# Altium footprint library IC.PcbLib: 93 footprints (part 6 of 6)
Each footprint in its own frame and in the unit in brackets; x right, y up, seen from the top. Pads: shape width x height; smd on the part's side, far side on the other; paste and mask are expansions set on the pad; w line width, h text height; cw(c..) or ccw(c..) is an arc to the next point about the centre after c.
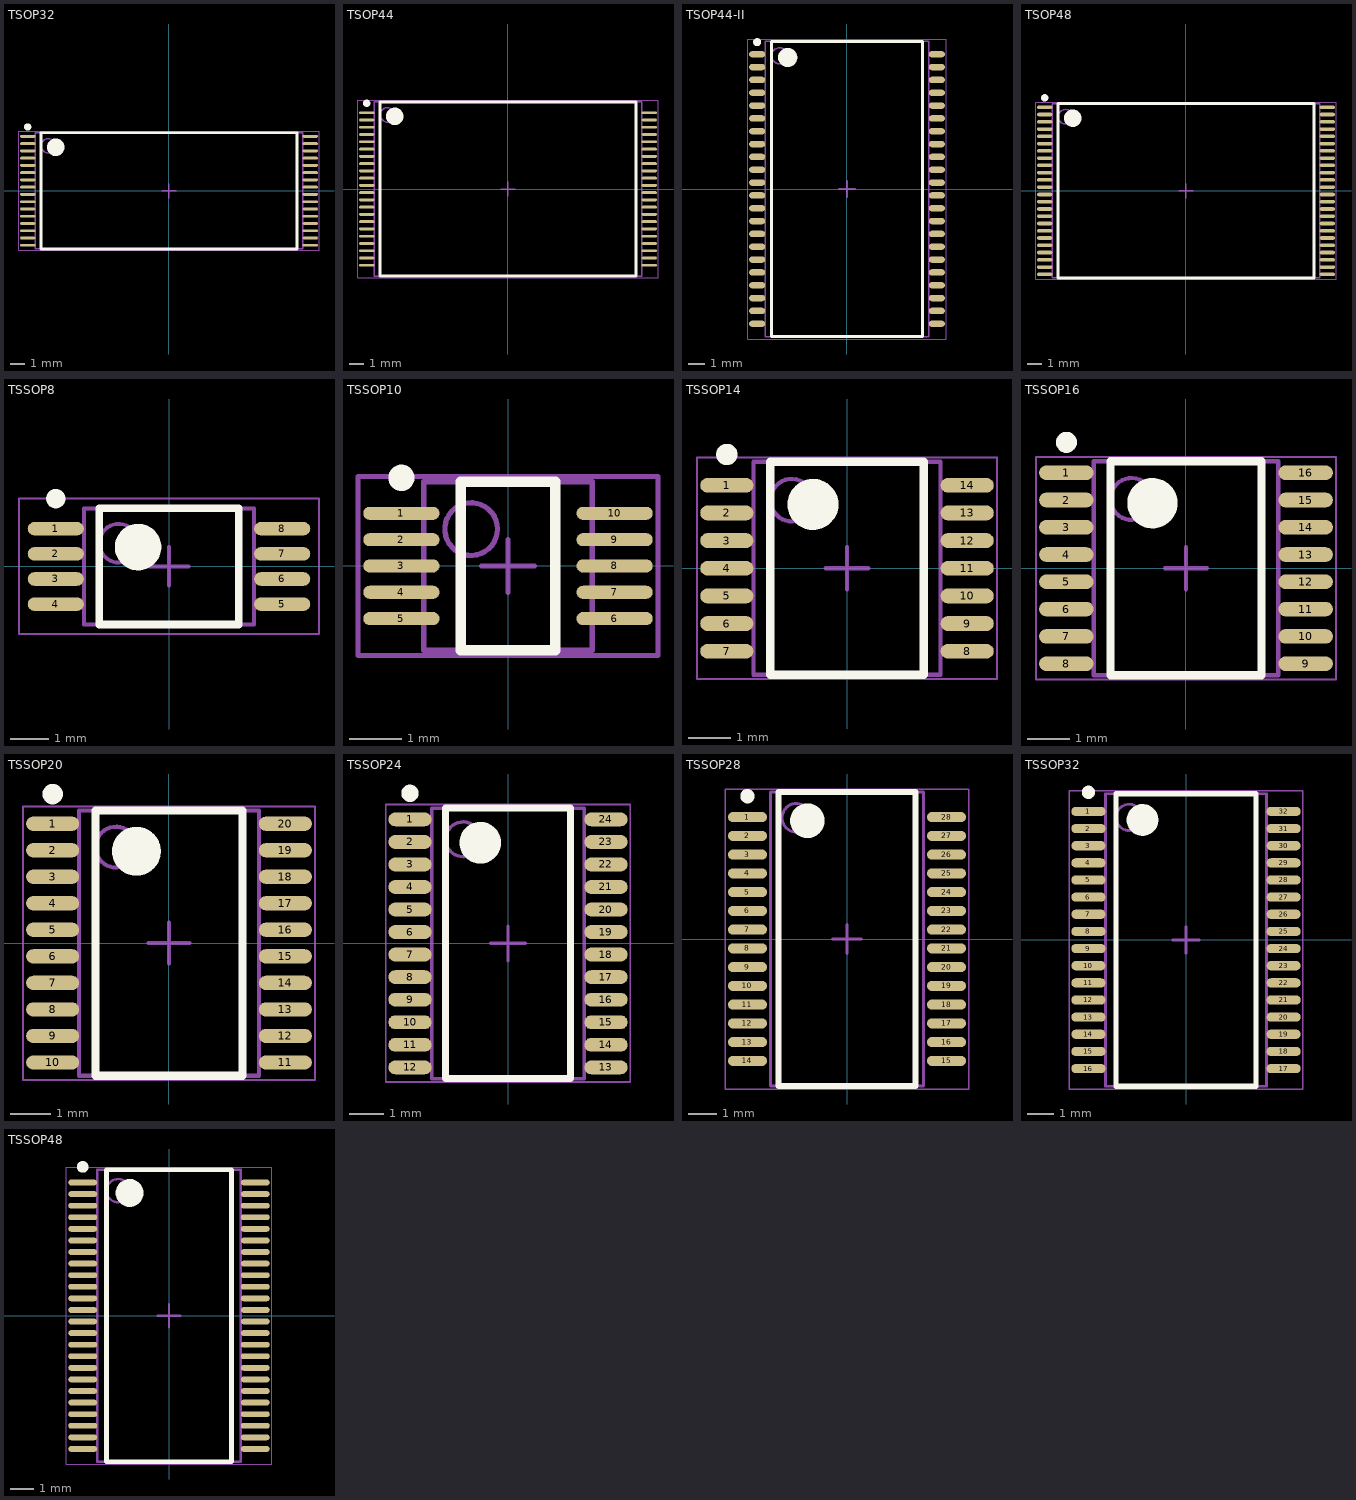
[diagram p5: the footprints below, top view; thin cyan lines are the x and y axes]

## TSOP32 [mm] "TSOP, 32-Leads, Body 8.00x18.40mm, Pitch 0.50mm, IPC High Density"
height 1.1
pads (32):
  oval 1.05x0.2 smd: 1(-9.725,3.75) 2(-9.725,3.25) 3(-9.725,2.75) 4(-9.725,2.25) 5(-9.725,1.75) 6(-9.725,1.25) 7(-9.725,0.75) 8(-9.725,0.25) 9(-9.725,-0.25) 10(-9.725,-0.75) 11(-9.725,-1.25) 12(-9.725,-1.75) 13(-9.725,-2.25) 14(-9.725,-2.75) 15(-9.725,-3.25) 16(-9.725,-3.75) 17(9.725,-3.75) 18(9.725,-3.25) 19(9.725,-2.75) 20(9.725,-2.25) 21(9.725,-1.75) 22(9.725,-1.25) 23(9.725,-0.75) 24(9.725,-0.25) 25(9.725,0.25) 26(9.725,0.75) 27(9.725,1.25) 28(9.725,1.75) 29(9.725,2.25) 30(9.725,2.75) 31(9.725,3.25) 32(9.725,3.75)
Top Overlay:
  circle w0.25: c-9.725,4.4 r0.125
  circle w0.6: c-7.8,3 r0.3
  lines w0.2: -8.8,-4 -8.8,4 8.8,4 8.8,-4 -8.8,-4
Mechanical 13:
  circle w0.1: c-8.3,3.1 r0.5
  lines w0.1: -9.2,-4 -9.2,4 9.2,4 9.2,-4 -9.2,-4
Mechanical 15:
  lines w0.05: -10.325,-4.1 -10.325,4.1 10.325,4.1 10.325,-4.1 -10.325,-4.1
  lines w0.1: -0.5,0 0.5,0 ; 0,-0.5 0,0.5
3D body "TSSOP50P2000X150-32N.step": height 1.5, standoff 0, extent -10,-4 10,4

## TSOP44 [mm] "TSOP, 44-Leads, Body 12.00x18.40mm, Pitch 0.50mm, IPC High Density"
height 1.2
pads (44):
  oval 1.05x0.2 smd: 1(-9.725,5.25) 2(-9.725,4.75) 3(-9.725,4.25) 4(-9.725,3.75) 5(-9.725,3.25) 6(-9.725,2.75) 7(-9.725,2.25) 8(-9.725,1.75) 9(-9.725,1.25) 10(-9.725,0.75) 11(-9.725,0.25) 12(-9.725,-0.25) 13(-9.725,-0.75) 14(-9.725,-1.25) 15(-9.725,-1.75) 16(-9.725,-2.25) 17(-9.725,-2.75) 18(-9.725,-3.25) 19(-9.725,-3.75) 20(-9.725,-4.25) 21(-9.725,-4.75) 22(-9.725,-5.25) 23(9.725,-5.25) 24(9.725,-4.75) 25(9.725,-4.25) 26(9.725,-3.75) 27(9.725,-3.25) 28(9.725,-2.75) 29(9.725,-2.25) 30(9.725,-1.75) 31(9.725,-1.25) 32(9.725,-0.75) 33(9.725,-0.25) 34(9.725,0.25) 35(9.725,0.75) 36(9.725,1.25) 37(9.725,1.75) 38(9.725,2.25) 39(9.725,2.75) 40(9.725,3.25) 41(9.725,3.75) 42(9.725,4.25) 43(9.725,4.75) 44(9.725,5.25)
Top Overlay:
  circle w0.6: c-7.8,5 r0.3
  circle w0.25: c-9.725,5.9 r0.125
  lines w0.2: -8.8,-6 8.8,-6 8.8,6 -8.8,6 -8.8,-6
Mechanical 13:
  circle w0.1: c-8.3,5.1 r0.5
  lines w0.1: -9.2,-6 9.2,-6 9.2,6 -9.2,6 -9.2,-6
Mechanical 15:
  lines w0.05: -10.325,-6.1 10.325,-6.1 10.325,6.1 -10.325,6.1 -10.325,-6.1
  lines w0.1: -0.5,0 0.5,0 ; 0,-0.5 0,0.5
3D body "TSSOP50P2000X150-44N.step": height 1.5, standoff 0, extent -10,-6 10,6

## TSOP44-II [mm] "TSOP-II, 44-Leads, Body 18.41x10.16mm, Pitch 0.80mm, IPC High Density"
height 1.2
pads (44):
  oval 1x0.4 smd: 1(-5.6,8.4) 2(-5.6,7.6) 3(-5.6,6.8) 4(-5.6,6) 5(-5.6,5.2) 6(-5.6,4.4) 7(-5.6,3.6) 8(-5.6,2.8) 9(-5.6,2) 10(-5.6,1.2) 11(-5.6,0.4) 12(-5.6,-0.4) 13(-5.6,-1.2) 14(-5.6,-2) 15(-5.6,-2.8) 16(-5.6,-3.6) 17(-5.6,-4.4) 18(-5.6,-5.2) 19(-5.6,-6) 20(-5.6,-6.8) 21(-5.6,-7.6) 22(-5.6,-8.4) 23(5.6,-8.4) 24(5.6,-7.6) 25(5.6,-6.8) 26(5.6,-6) 27(5.6,-5.2) 28(5.6,-4.4) 29(5.6,-3.6) 30(5.6,-2.8) 31(5.6,-2) 32(5.6,-1.2) 33(5.6,-0.4) 34(5.6,0.4) 35(5.6,1.2) 36(5.6,2) 37(5.6,2.8) 38(5.6,3.6) 39(5.6,4.4) 40(5.6,5.2) 41(5.6,6) 42(5.6,6.8) 43(5.6,7.6) 44(5.6,8.4)
Top Overlay:
  circle w0.25: c-5.6,9.15 r0.125
  circle w0.6: c-3.7,8.2 r0.3
  lines w0.2: -4.7,-9.2 -4.7,9.2 4.7,9.2 4.7,-9.2 -4.7,-9.2
Mechanical 13:
  circle w0.1: c-4.2,8.3 r0.5
  lines w0.1: -5.1,-9.2 -5.1,9.2 5.1,9.2 5.1,-9.2 -5.1,-9.2
Mechanical 15:
  lines w0.05: -6.2,-9.35 -6.2,9.35 6.2,9.35 6.2,-9.35 -6.2,-9.35
  lines w0.1: -0.5,0 0.5,0 ; 0,-0.5 0,0.5
3D body "User Library-IPC SO (1).step": height 1.35, standoff 0, extent -5.908,-9.27 5.908,9.27

## TSOP48 [mm] "TSOP, 48-Leads, Body 12.00x18.40mm, Pitch 0.50mm, IPC High Density"
height 1
pads (48):
  oval 1.05x0.25 smd: 1(-9.725,5.75) 2(-9.725,5.25) 3(-9.725,4.75) 4(-9.725,4.25) 5(-9.725,3.75) 6(-9.725,3.25) 7(-9.725,2.75) 8(-9.725,2.25) 9(-9.725,1.75) 10(-9.725,1.25) 11(-9.725,0.75) 12(-9.725,0.25) 13(-9.725,-0.25) 14(-9.725,-0.75) 15(-9.725,-1.25) 16(-9.725,-1.75) 17(-9.725,-2.25) 18(-9.725,-2.75) 19(-9.725,-3.25) 20(-9.725,-3.75) 21(-9.725,-4.25) 22(-9.725,-4.75) 23(-9.725,-5.25) 24(-9.725,-5.75) 25(9.725,-5.75) 26(9.725,-5.25) 27(9.725,-4.75) 28(9.725,-4.25) 29(9.725,-3.75) 30(9.725,-3.25) 31(9.725,-2.75) 32(9.725,-2.25) 33(9.725,-1.75) 34(9.725,-1.25) 35(9.725,-0.75) 36(9.725,-0.25) 37(9.725,0.25) 38(9.725,0.75) 39(9.725,1.25) 40(9.725,1.75) 41(9.725,2.25) 42(9.725,2.75) 43(9.725,3.25) 44(9.725,3.75) 45(9.725,4.25) 46(9.725,4.75) 47(9.725,5.25) 48(9.725,5.75)
Top Overlay:
  circle w0.25: c-9.725,6.4 r0.125
  circle w0.6: c-7.8,5 r0.3
  lines w0.2: -8.8,-6 -8.8,6 8.8,6 8.8,-6 -8.8,-6
Mechanical 13:
  circle w0.1: c-8.3,5.1 r0.5
  lines w0.1: -9.2,-6 -9.2,6 9.2,6 9.2,-6 -9.2,-6
Mechanical 15:
  lines w0.05: -10.325,-6.1 -10.325,6.1 10.325,6.1 10.325,-6.1 -10.325,-6.1
  lines w0.1: -0.5,0 0.5,0 ; 0,-0.5 0,0.5
3D body "User Library-TSOP48-1.STEP": height 1.2, standoff 0, extent -10.1,-6.05 10.1,6.05

## TSSOP8 [mm] "TSSOP, 8-Leads, Body 3.00x4.40mm, Pitch 0.65mm, IPC Medium Density"
height 1.5
pads (8):
  oval 1.45x0.35 smd: 1(-2.925,0.975) 2(-2.925,0.325) 3(-2.925,-0.325) 4(-2.925,-0.975) 5(2.925,-0.975) 6(2.925,-0.325) 7(2.925,0.325) 8(2.925,0.975)
Top Overlay:
  circle w0.25: c-2.925,1.75 r0.125
  circle w0.6: c-0.8,0.5 r0.3
  lines w0.2: -1.8,-1.5 -1.8,1.5 1.8,1.5 1.8,-1.5 -1.8,-1.5
Mechanical 13:
  circle w0.1: c-1.3,0.6 r0.5
  lines w0.1: -2.2,-1.5 -2.2,1.5 2.2,1.5 2.2,-1.5 -2.2,-1.5
Mechanical 15:
  lines w0.05: -3.875,-1.75 -3.875,1.75 3.875,1.75 3.875,-1.75 -3.875,-1.75
  lines w0.1: -0.5,0 0.5,0 ; 0,-0.5 0,0.5
3D body "User Library-tsop8.step": height 1.2, standoff 0, extent -3.2,-1.55 3.2,1.55

## TSSOP10 [mm] "TSSOP, 10-Leads, Body 3x3mm, Pitch 0.5mm, IPC High Density"
height 1.1
pads (10):
  oval 1.45x0.25 smd: 1(-2.025,1) 2(-2.025,0.5) 3(-2.025,0) 4(-2.025,-0.5) 5(-2.025,-1) 6(2.025,-1) 7(2.025,-0.5) 8(2.025,0) 9(2.025,0.5) 10(2.025,1)
Top Overlay:
  circle w0.25: c-2.025,1.675 r0.125
  lines w0.2: -0.9,-1.6 0.9,-1.6 0.9,1.6 -0.9,1.6 -0.9,-1.6
Mechanical 13:
  circle w0.1: c-0.7,0.7 r0.5
  lines w0.1: -1.6,-1.6 1.6,-1.6 1.6,1.6 -1.6,1.6 -1.6,-1.6
Mechanical 15:
  lines w0.1: -0.5,0 0.5,0 ; 0,-0.5 0,0.5 ; -2.85,-1.7 2.85,-1.7 2.85,1.7 -2.85,1.7 -2.85,-1.7
3D body "User Library-IPC SO.step": height 1.1, standoff 0, extent -2.478,-1.55 2.478,1.55

## TSSOP14 [mm] "TSSOP, 14-Leads, Body 5.00x4.40mm, Pitch 0.65mm, IPC High Density"
height 1
pads (14):
  oval 1.25x0.35 smd: 1(-2.825,1.95) 2(-2.825,1.3) 3(-2.825,0.65) 4(-2.825,0) 5(-2.825,-0.65) 6(-2.825,-1.3) 7(-2.825,-1.95) 8(2.825,-1.95) 9(2.825,-1.3) 10(2.825,-0.65) 11(2.825,0) 12(2.825,0.65) 13(2.825,1.3) 14(2.825,1.95)
Top Overlay:
  circle w0.6: c-0.8,1.5 r0.3
  circle w0.25: c-2.825,2.675 r0.125
  lines w0.2: -1.8,-2.5 1.8,-2.5 1.8,2.5 -1.8,2.5 -1.8,-2.5
Mechanical 13:
  circle w0.1: c-1.3,1.6 r0.5
  lines w0.1: -2.2,-2.5 2.2,-2.5 2.2,2.5 -2.2,2.5 -2.2,-2.5
Mechanical 15:
  lines w0.05: -3.525,-2.6 3.525,-2.6 3.525,2.6 -3.525,2.6 -3.525,-2.6
  lines w0.1: -0.5,0 0.5,0 ; 0,-0.5 0,0.5
3D body "User Library-IPC SO.step": height 1.25, standoff 0, extent -3.228,-2.55 3.228,2.55

## TSSOP16 [mm] "TSSOP, 16-Leads, Body 5.10x4.40mm, Pitch 0.65mm, IPC High Density"
height 1.2
pads (16):
  oval 1.3x0.35 smd: 1(-2.85,2.275) 2(-2.85,1.625) 3(-2.85,0.975) 4(-2.85,0.325) 5(-2.85,-0.325) 6(-2.85,-0.975) 7(-2.85,-1.625) 8(-2.85,-2.275) 9(2.85,-2.275) 10(2.85,-1.625) 11(2.85,-0.975) 12(2.85,-0.325) 13(2.85,0.325) 14(2.85,0.975) 15(2.85,1.625) 16(2.85,2.275)
Top Overlay:
  circle w0.6: c-0.8,1.55 r0.3
  circle w0.25: c-2.85,3 r0.125
  lines w0.2: -1.8,-2.55 1.8,-2.55 1.8,2.55 -1.8,2.55 -1.8,-2.55
Mechanical 13:
  circle w0.1: c-1.3,1.65 r0.5
  lines w0.1: -2.2,-2.55 2.2,-2.55 2.2,2.55 -2.2,2.55 -2.2,-2.55
Mechanical 15:
  lines w0.05: -3.575,-2.65 3.575,-2.65 3.575,2.65 -3.575,2.65 -3.575,-2.65
  lines w0.1: -0.5,0 0.5,0 ; 0,-0.5 0,0.5
3D body "User Library-IPC SO.step": height 1.25, standoff 0, extent -3.228,-2.53 3.228,2.57

## TSSOP20 [mm] "TSSOP, 20-Leads, Body 6.50x4.40mm, Pitch 0.65mm, IPC High Density"
height 1.2
pads (20):
  oval 1.3x0.35 smd: 1(-2.85,2.925) 2(-2.85,2.275) 3(-2.85,1.625) 4(-2.85,0.975) 5(-2.85,0.325) 6(-2.85,-0.325) 7(-2.85,-0.975) 8(-2.85,-1.625) 9(-2.85,-2.275) 10(-2.85,-2.925) 11(2.85,-2.925) 12(2.85,-2.275) 13(2.85,-1.625) 14(2.85,-0.975) 15(2.85,-0.325) 16(2.85,0.325) 17(2.85,0.975) 18(2.85,1.625) 19(2.85,2.275) 20(2.85,2.925)
Top Overlay:
  circle w0.6: c-0.8,2.25 r0.3
  circle w0.25: c-2.85,3.65 r0.125
  lines w0.2: -1.8,-3.25 1.8,-3.25 1.8,3.25 -1.8,3.25 -1.8,-3.25
Mechanical 13:
  circle w0.1: c-1.3,2.35 r0.5
  lines w0.1: -2.2,-3.25 2.2,-3.25 2.2,3.25 -2.2,3.25 -2.2,-3.25
Mechanical 15:
  lines w0.05: -3.575,-3.35 3.575,-3.35 3.575,3.35 -3.575,3.35 -3.575,-3.35
  lines w0.1: -0.5,0 0.5,0 ; 0,-0.5 0,0.5
3D body "User Library-IPC SO.step": height 1.25, standoff 0, extent -3.228,-3.3 3.228,3.3

## TSSOP24 [mm] "TSSOP, 24-Leads, Body 7.80x4.40mm, Pitch 0.65mm, IPC High Density"
height 1.1
pads (24):
  oval 1.25x0.4 smd: 1(-2.825,3.575) 2(-2.825,2.925) 3(-2.825,2.275) 4(-2.825,1.625) 5(-2.825,0.975) 6(-2.825,0.325) 7(-2.825,-0.325) 8(-2.825,-0.975) 9(-2.825,-1.625) 10(-2.825,-2.275) 11(-2.825,-2.925) 12(-2.825,-3.575) 13(2.825,-3.575) 14(2.825,-2.925) 15(2.825,-2.275) 16(2.825,-1.625) 17(2.825,-0.975) 18(2.825,-0.325) 19(2.825,0.325) 20(2.825,0.975) 21(2.825,1.625) 22(2.825,2.275) 23(2.825,2.925) 24(2.825,3.575)
Top Overlay:
  circle w0.6: c-0.8,2.9 r0.3
  circle w0.25: c-2.825,4.325 r0.125
  lines w0.2: -1.8,-3.9 1.8,-3.9 1.8,3.9 -1.8,3.9 -1.8,-3.9
Mechanical 13:
  circle w0.1: c-1.3,3 r0.5
  lines w0.1: -2.2,-3.9 2.2,-3.9 2.2,3.9 -2.2,3.9 -2.2,-3.9
Mechanical 15:
  lines w0.05: -3.525,-4 3.525,-4 3.525,4 -3.525,4 -3.525,-4
  lines w0.1: -0.5,0 0.5,0 ; 0,-0.5 0,0.5
3D body "User Library-IPC SO.step": height 1.25, standoff 0, extent -3.228,-3.95 3.228,3.95

## TSSOP28 [mm] "TSSOP, 28-Leads, Body 10.20x5.30mm, Pitch 0.65mm, IPC High Density"
height 1.2
pads (28):
  oval 1.35x0.35 smd: 1(-3.45,4.225) 2(-3.45,3.575) 3(-3.45,2.925) 4(-3.45,2.275) 5(-3.45,1.625) 6(-3.45,0.975) 7(-3.45,0.325) 8(-3.45,-0.325) 9(-3.45,-0.975) 10(-3.45,-1.625) 11(-3.45,-2.275) 12(-3.45,-2.925) 13(-3.45,-3.575) 14(-3.45,-4.225) 15(3.45,-4.225) 16(3.45,-3.575) 17(3.45,-2.925) 18(3.45,-2.275) 19(3.45,-1.625) 20(3.45,-0.975) 21(3.45,-0.325) 22(3.45,0.325) 23(3.45,0.975) 24(3.45,1.625) 25(3.45,2.275) 26(3.45,2.925) 27(3.45,3.575) 28(3.45,4.225)
Top Overlay:
  circle w0.6: c-1.375,4.1 r0.3
  circle w0.25: c-3.45,4.95 r0.125
  lines w0.2: -2.375,-5.1 2.375,-5.1 2.375,5.1 -2.375,5.1 -2.375,-5.1
Mechanical 13:
  circle w0.1: c-1.75,4.2 r0.5
  lines w0.1: -2.65,-5.1 2.65,-5.1 2.65,5.1 -2.65,5.1 -2.65,-5.1
Mechanical 15:
  lines w0.05: -4.225,-5.2 4.225,-5.2 4.225,5.2 -4.225,5.2 -4.225,-5.2
  lines w0.1: -0.5,0 0.5,0 ; 0,-0.5 0,0.5
3D body "SOP65P770x200-28N.step": height 2.15, standoff 0, extent -3.878,-5.165 3.878,5.165

## TSSOP32 [mm] "TSSOP, 32-Leads, Body 11.10x6.10mm, Pitch 0.65mm, IPC High Density"
height 1.1
pads (32):
  oval 1.3x0.35 smd: 1(-3.7,4.875) 2(-3.7,4.225) 3(-3.7,3.575) 4(-3.7,2.925) 5(-3.7,2.275) 6(-3.7,1.625) 7(-3.7,0.975) 8(-3.7,0.325) 9(-3.7,-0.325) 10(-3.7,-0.975) 11(-3.7,-1.625) 12(-3.7,-2.275) 13(-3.7,-2.925) 14(-3.7,-3.575) 15(-3.7,-4.225) 16(-3.7,-4.875) 17(3.7,-4.875) 18(3.7,-4.225) 19(3.7,-3.575) 20(3.7,-2.925) 21(3.7,-2.275) 22(3.7,-1.625) 23(3.7,-0.975) 24(3.7,-0.325) 25(3.7,0.325) 26(3.7,0.975) 27(3.7,1.625) 28(3.7,2.275) 29(3.7,2.925) 30(3.7,3.575) 31(3.7,4.225) 32(3.7,4.875)
Top Overlay:
  circle w0.25: c-3.7,5.6 r0.125
  circle w0.6: c-1.65,4.55 r0.3
  lines w0.2: -2.65,-5.55 -2.65,5.55 2.65,5.55 2.65,-5.55 -2.65,-5.55
Mechanical 13:
  circle w0.1: c-2.15,4.65 r0.5
  lines w0.1: -3.05,-5.55 -3.05,5.55 3.05,5.55 3.05,-5.55 -3.05,-5.55
Mechanical 15:
  lines w0.05: -4.425,-5.65 -4.425,5.65 4.425,5.65 4.425,-5.65 -4.425,-5.65
  lines w0.1: -0.5,0 0.5,0 ; 0,-0.5 0,0.5
3D body "User Library-TSSOP-32 11_1x6_2.STEP": height 1.1, standoff 0, extent -4.05,-5.55 4.05,5.55

## TSSOP48 [mm] "TSSOP, 48-Leads, Body 12.60x6.20mm, Pitch 0.50mm, IPC High Density"
height 1.1
pads (48):
  oval 1.25x0.25 smd: 1(-3.725,5.75) 2(-3.725,5.25) 3(-3.725,4.75) 4(-3.725,4.25) 5(-3.725,3.75) 6(-3.725,3.25) 7(-3.725,2.75) 8(-3.725,2.25) 9(-3.725,1.75) 10(-3.725,1.25) 11(-3.725,0.75) 12(-3.725,0.25) 13(-3.725,-0.25) 14(-3.725,-0.75) 15(-3.725,-1.25) 16(-3.725,-1.75) 17(-3.725,-2.25) 18(-3.725,-2.75) 19(-3.725,-3.25) 20(-3.725,-3.75) 21(-3.725,-4.25) 22(-3.725,-4.75) 23(-3.725,-5.25) 24(-3.725,-5.75) 25(3.725,-5.75) 26(3.725,-5.25) 27(3.725,-4.75) 28(3.725,-4.25) 29(3.725,-3.75) 30(3.725,-3.25) 31(3.725,-2.75) 32(3.725,-2.25) 33(3.725,-1.75) 34(3.725,-1.25) 35(3.725,-0.75) 36(3.725,-0.25) 37(3.725,0.25) 38(3.725,0.75) 39(3.725,1.25) 40(3.725,1.75) 41(3.725,2.25) 42(3.725,2.75) 43(3.725,3.25) 44(3.725,3.75) 45(3.725,4.25) 46(3.725,4.75) 47(3.725,5.25) 48(3.725,5.75)
Top Overlay:
  circle w0.25: c-3.725,6.425 r0.125
  circle w0.6: c-1.7,5.3 r0.3
  lines w0.2: -2.7,-6.3 -2.7,6.3 2.7,6.3 2.7,-6.3 -2.7,-6.3
Mechanical 13:
  circle w0.1: c-2.2,5.4 r0.5
  lines w0.1: -3.1,-6.3 -3.1,6.3 3.1,6.3 3.1,-6.3 -3.1,-6.3
Mechanical 15:
  lines w0.05: -4.425,-6.4 -4.425,6.4 4.425,6.4 4.425,-6.4 -4.425,-6.4
  lines w0.1: -0.5,0 0.5,0 ; 0,-0.5 0,0.5
3D body "User Library-TSSOP-48 12_6x6_2.STEP": height 1.1, standoff 0, extent -4.05,-6.3 3.95,6.3